# Altium footprint library PcbLib_ICs_part2.PcbLib: 66 footprints (part 3 of 5) (continued)
## LFCSP-24(CP-24-14) [mm] "QFN, 24-Leads, Body 4.00x4.00mm, Pitch 0.50mm, Thermal Pad 2.30x2.30mm, IPC Medium Density" (continued)
  text ".Designator" at -3.443,-1.467 h2
Top Text:
  lines w0.05: -2.65,-2.65 2.65,-2.65 2.65,2.65 -2.65,2.65 -2.65,-2.65
  lines w0.1: -0.5,0 0.5,0 ; 0,-0.5 0,0.5
3D body "AD9508_LFCSP24.x_t": height 0.8, standoff 0, extent -2.025,-2.025 2.025,2.025

## LFCSP-48(HCP-48-1) [mm] "QFN, 48-Leads, Body 7x7mm, Pitch 0.50mm, Thermal Pad 5.60x5.60mm, IPC Medium Density"
height 0.55
pads (49):
  rect 0.7x0.25 smd paste+0 mask+0.05: 1(-3.45,2.75)
  oval 0.7x0.25 smd paste+0 mask+0.05: 2(-3.45,2.25) 3(-3.45,1.75) 4(-3.45,1.25) 5(-3.45,0.75) 6(-3.45,0.25) 7(-3.45,-0.25) 8(-3.45,-0.75) 9(-3.45,-1.25) 10(-3.45,-1.75) 11(-3.45,-2.25) 12(-3.45,-2.75) 25(3.45,-2.75) 26(3.45,-2.25) 27(3.45,-1.75) 28(3.45,-1.25) 29(3.45,-0.75) 30(3.45,-0.25) 31(3.45,0.25) 32(3.45,0.75) 33(3.45,1.25) 34(3.45,1.75) 35(3.45,2.25) 36(3.45,2.75)
  oval 0.25x0.7 smd paste+0 mask+0.05: 13(-2.75,-3.45) 14(-2.25,-3.45) 15(-1.75,-3.45) 16(-1.25,-3.45) 17(-0.75,-3.45) 18(-0.25,-3.45) 19(0.25,-3.45) 20(0.75,-3.45) 21(1.25,-3.45) 22(1.75,-3.45) 23(2.25,-3.45) 24(2.75,-3.45) 37(2.75,3.45) 38(2.25,3.45) 39(1.75,3.45) 40(1.25,3.45) 41(0.75,3.45) 42(0.25,3.45) 43(-0.25,3.45) 44(-0.75,3.45) 45(-1.25,3.45) 46(-1.75,3.45) 47(-2.25,3.45) 48(-2.75,3.45)
  rrect10% 5.6x5.6 smd paste-50 mask+0.05: EP(0,0)
via -2,-1 diameter 0.7 hole 0.3
via -1,-2 diameter 0.7 hole 0.3
via 1,-2 diameter 0.7 hole 0.3
via 2,-1 diameter 0.7 hole 0.3
via 2,1 diameter 0.7 hole 0.3
via 1,2 diameter 0.7 hole 0.3
via -2,1 diameter 0.7 hole 0.3
via -1,2 diameter 0.7 hole 0.3
via 2,-2 diameter 0.7 hole 0.3
via -2,-2 diameter 0.7 hole 0.3
via -2,2 diameter 0.7 hole 0.3
via 2,2 diameter 0.7 hole 0.3
via 0,0 diameter 0.7 hole 0.3
via 1,1 diameter 0.7 hole 0.3
via -1,1 diameter 0.7 hole 0.3
via -1,-1 diameter 0.7 hole 0.3
via 1,-1 diameter 0.7 hole 0.3
via -1,0 diameter 0.7 hole 0.3
via 0,-1 diameter 0.7 hole 0.3
via 0,1 diameter 0.7 hole 0.3
via 1,0 diameter 0.7 hole 0.3
Top Overlay:
  circle w0.25: c-4.4,2.75 r0.125
  lines w0.2: -3.65,-3.275 -3.65,-3.65 -3.275,-3.65 ; -3.65,3.275 -3.65,3.65 -3.275,3.65 ; 3.275,-3.65 3.65,-3.65 3.65,-3.275 ; 3.275,3.65 3.65,3.65 3.65,3.275
Top Paste:
  region: -2.2,-2.7 -2.2,-2.2 -2.7,-2.2 -2.7,-2.7
  region: -1.5,-2.7 -1.5,-2.2 -2,-2.2 -2,-2.7
  region: -0.8,-2.7 -0.8,-2.2 -1.3,-2.2 -1.3,-2.7
  region: 2.7,-2.7 2.7,-2.2 2.2,-2.2 2.2,-2.7
  region: 1.3,-2.7 1.3,-2.2 0.8,-2.2 0.8,-2.7
  region: 2,-2.7 2,-2.2 1.5,-2.2 1.5,-2.7
  region: -0.1,-2.7 -0.1,-2.2 -0.6,-2.2 -0.6,-2.7
  region: 0.6,-2.7 0.6,-2.2 0.1,-2.2 0.1,-2.7
  region: -2.2,-2 -2.2,-1.5 -2.7,-1.5 -2.7,-2
  region: -1.5,-2 -1.5,-1.5 -2,-1.5 -2,-2
  region: -0.8,-2 -0.8,-1.5 -1.3,-1.5 -1.3,-2
  region: 2.7,-2 2.7,-1.5 2.2,-1.5 2.2,-2
  region: 1.3,-2 1.3,-1.5 0.8,-1.5 0.8,-2
  region: 2,-2 2,-1.5 1.5,-1.5 1.5,-2
  region: -0.1,-2 -0.1,-1.5 -0.6,-1.5 -0.6,-2
  region: 0.6,-2 0.6,-1.5 0.1,-1.5 0.1,-2
  region: -2.2,-1.3 -2.2,-0.8 -2.7,-0.8 -2.7,-1.3
  region: -1.5,-1.3 -1.5,-0.8 -2,-0.8 -2,-1.3
  region: -0.8,-1.3 -0.8,-0.8 -1.3,-0.8 -1.3,-1.3
  region: 2.7,-1.3 2.7,-0.8 2.2,-0.8 2.2,-1.3
  region: 1.3,-1.3 1.3,-0.8 0.8,-0.8 0.8,-1.3
  region: 2,-1.3 2,-0.8 1.5,-0.8 1.5,-1.3
  region: -0.1,-1.3 -0.1,-0.8 -0.6,-0.8 -0.6,-1.3
  region: 0.6,-1.3 0.6,-0.8 0.1,-0.8 0.1,-1.3
  region: 2.2,2.7 2.2,2.2 2.7,2.2 2.7,2.7
  region: 1.5,2.7 1.5,2.2 2,2.2 2,2.7
  region: 0.8,2.7 0.8,2.2 1.3,2.2 1.3,2.7
  region: -2.7,2.7 -2.7,2.2 -2.2,2.2 -2.2,2.7
  region: -1.3,2.7 -1.3,2.2 -0.8,2.2 -0.8,2.7
  region: -2,2.7 -2,2.2 -1.5,2.2 -1.5,2.7
  region: 0.1,2.7 0.1,2.2 0.6,2.2 0.6,2.7
  region: -0.6,2.7 -0.6,2.2 -0.1,2.2 -0.1,2.7
  region: 2.2,2 2.2,1.5 2.7,1.5 2.7,2
  region: 1.5,2 1.5,1.5 2,1.5 2,2
  region: 0.8,2 0.8,1.5 1.3,1.5 1.3,2
  region: -2.7,2 -2.7,1.5 -2.2,1.5 -2.2,2
  region: -1.3,2 -1.3,1.5 -0.8,1.5 -0.8,2
  region: -2,2 -2,1.5 -1.5,1.5 -1.5,2
  region: 0.1,2 0.1,1.5 0.6,1.5 0.6,2
  region: -0.6,2 -0.6,1.5 -0.1,1.5 -0.1,2
  region: 2.2,1.3 2.2,0.8 2.7,0.8 2.7,1.3
  region: 1.5,1.3 1.5,0.8 2,0.8 2,1.3
  region: 0.8,1.3 0.8,0.8 1.3,0.8 1.3,1.3
  region: -2.7,1.3 -2.7,0.8 -2.2,0.8 -2.2,1.3
  region: -1.3,1.3 -1.3,0.8 -0.8,0.8 -0.8,1.3
  region: -2,1.3 -2,0.8 -1.5,0.8 -1.5,1.3
  region: 0.1,1.3 0.1,0.8 0.6,0.8 0.6,1.3
  region: -0.6,1.3 -0.6,0.8 -0.1,0.8 -0.1,1.3
  region: 2.7,-0.6 2.7,-0.1 2.2,-0.1 2.2,-0.6
  region: 2.2,0.6 2.2,0.1 2.7,0.1 2.7,0.6
  region: 2,-0.6 2,-0.1 1.5,-0.1 1.5,-0.6
  region: 1.5,0.6 1.5,0.1 2,0.1 2,0.6
  region: 1.3,-0.6 1.3,-0.1 0.8,-0.1 0.8,-0.6
  region: 0.8,0.6 0.8,0.1 1.3,0.1 1.3,0.6
  region: -2.7,0.6 -2.7,0.1 -2.2,0.1 -2.2,0.6
  region: -2.2,-0.6 -2.2,-0.1 -2.7,-0.1 -2.7,-0.6
  region: -1.3,0.6 -1.3,0.1 -0.8,0.1 -0.8,0.6
  region: -2,0.6 -2,0.1 -1.5,0.1 -1.5,0.6
  region: -1.5,-0.6 -1.5,-0.1 -2,-0.1 -2,-0.6
  region: -0.8,-0.6 -0.8,-0.1 -1.3,-0.1 -1.3,-0.6
  region: 0.1,0.6 0.1,0.1 0.6,0.1 0.6,0.6
  region: -0.6,0.6 -0.6,0.1 -0.1,0.1 -0.1,0.6
  region: -0.1,-0.6 -0.1,-0.1 -0.6,-0.1 -0.6,-0.6
  region: 0.6,-0.6 0.6,-0.1 0.1,-0.1 0.1,-0.6
Bottom Solder:
  region: -2.8,2.8 -0.55,2.8 0,2.25 0.55,2.8 2.8,2.8 2.8,0.55 2.25,0 2.8,-0.55 2.8,-2.8 0.55,-2.8 0,-2.25 -0.55,-2.8 -2.8,-2.8 -2.8,-0.55 -2.25,0 -2.8,0.55
Top Assy:
  drawing of 173 lines, arcs and shapes, not listed
  text ".Designator" at -3.443,-1.967 h2
Top Text:
  lines w0.05: -4.05,-4.05 4.05,-4.05 4.05,4.05 -4.05,4.05 -4.05,-4.05
  lines w0.1: -0.5,0 0.5,0 ; 0,-0.5 0,0.5
3D body "HCP-48-1.x_t": height 0.9, standoff 0, extent -3.525,-3.525 3.525,3.525

## LQ100 [mm] "LQFP, 100-Leads, Body 14.00x14.00mm, Pitch 0.50mm, IPC Medium Density"
height 1.6
pads (100):
  rect 0.3x1.45 smd paste+0 mask+0.05: 1(-6,-7.725)
  oval 0.3x1.45 smd paste+0 mask+0.05: 2(-5.5,-7.725) 3(-5,-7.725) 4(-4.5,-7.725) 5(-4,-7.725) 6(-3.5,-7.725) 7(-3,-7.725) 8(-2.5,-7.725) 9(-2,-7.725) 10(-1.5,-7.725) 11(-1,-7.725) 12(-0.5,-7.725) 13(0,-7.725) 14(0.5,-7.725) 15(1,-7.725) 16(1.5,-7.725) 17(2,-7.725) 18(2.5,-7.725) 19(3,-7.725) 20(3.5,-7.725) 21(4,-7.725) 22(4.5,-7.725) 23(5,-7.725) 24(5.5,-7.725) 25(6,-7.725) 51(6,7.725) 52(5.5,7.725) 53(5,7.725) 54(4.5,7.725) 55(4,7.725) 56(3.5,7.725) 57(3,7.725) 58(2.5,7.725) 59(2,7.725) 60(1.5,7.725) 61(1,7.725) 62(0.5,7.725) 63(0,7.725) 64(-0.5,7.725) 65(-1,7.725) 66(-1.5,7.725) 67(-2,7.725) 68(-2.5,7.725) 69(-3,7.725) 70(-3.5,7.725) 71(-4,7.725) 72(-4.5,7.725) 73(-5,7.725) 74(-5.5,7.725) 75(-6,7.725)
  oval 1.45x0.3 smd paste+0 mask+0.05: 26(7.725,-6) 27(7.725,-5.5) 28(7.725,-5) 29(7.725,-4.5) 30(7.725,-4) 31(7.725,-3.5) 32(7.725,-3) 33(7.725,-2.5) 34(7.725,-2) 35(7.725,-1.5) 36(7.725,-1) 37(7.725,-0.5) 38(7.725,0) 39(7.725,0.5) 40(7.725,1) 41(7.725,1.5) 42(7.725,2) 43(7.725,2.5) 44(7.725,3) 45(7.725,3.5) 46(7.725,4) 47(7.725,4.5) 48(7.725,5) 49(7.725,5.5) 50(7.725,6) 76(-7.725,6) 77(-7.725,5.5) 78(-7.725,5) 79(-7.725,4.5) 80(-7.725,4) 81(-7.725,3.5) 82(-7.725,3) 83(-7.725,2.5) 84(-7.725,2) 85(-7.725,1.5) 86(-7.725,1) 87(-7.725,0.5) 88(-7.725,0) 89(-7.725,-0.5) 90(-7.725,-1) 91(-7.725,-1.5) 92(-7.725,-2) 93(-7.725,-2.5) 94(-7.725,-3) 95(-7.725,-3.5) 96(-7.725,-4) 97(-7.725,-4.5) 98(-7.725,-5) 99(-7.725,-5.5) 100(-7.725,-6)
Top Overlay:
  circle w0.6: c-5.5,-5.5 r0.3
  circle w0.25: c-6.75,-8.125 r0.125
  region: -6.4,-7.25 -6.4,-6.4 -7.25,-6.4 -7.25,-7.25
  lines w0.2: -7.15,6.525 -7.15,7.15 -6.55,7.15 ; 6.525,7.15 7.15,7.15 7.15,6.55 ; 6.55,-7.15 7.15,-7.15 7.15,-6.525
Bottom Simple Assy:
  rectangle: -8,5.888 -7,6.108
  rectangle: -8,5.388 -7,5.608
  rectangle: -8,4.888 -7,5.108
  rectangle: -8,4.388 -7,4.608
  rectangle: -8,2.388 -7,2.608
  rectangle: -8,2.888 -7,3.108
  rectangle: -8,3.388 -7,3.608
  rectangle: -8,3.888 -7,4.108
  rectangle: -8,-0.112 -7,0.108
  rectangle: -8,-0.612 -7,-0.392
  rectangle: -8,-1.112 -7,-0.893
  rectangle: -8,-1.612 -7,-1.392
  rectangle: -8,0.388 -7,0.608
  rectangle: -8,0.888 -7,1.108
  rectangle: -8,1.388 -7,1.608
  rectangle: -8,1.888 -7,2.108
  rectangle: -8,-4.112 -7,-3.892
  rectangle: -8,-4.612 -7,-4.392
  rectangle: -8,-5.113 -7,-4.893
  rectangle: -8,-5.613 -7,-5.393
  rectangle: -8,-3.612 -7,-3.393
  rectangle: -8,-3.113 -7,-2.893
  rectangle: -8,-2.612 -7,-2.392
  rectangle: -8,-2.112 -7,-1.892
  rectangle: -8,-6.112 -7,-5.892
  region: 5.89,7.998 5.89,6.998 6.11,6.998 6.11,7.998
  region: 5.39,7.998 5.39,6.998 5.61,6.998 5.61,7.998
  region: 4.89,7.998 4.89,6.998 5.11,6.998 5.11,7.998
  region: 4.39,7.998 4.39,6.998 4.61,6.998 4.61,7.998
  region: 2.39,7.998 2.39,6.998 2.61,6.998 2.61,7.998
  region: 2.89,7.998 2.89,6.998 3.11,6.998 3.11,7.998
  region: 3.39,7.998 3.39,6.998 3.61,6.998 3.61,7.998
  region: 3.89,7.998 3.89,6.998 4.11,6.998 4.11,7.998
  region: -0.11,7.998 -0.11,6.998 0.11,6.998 0.11,7.998
  region: -0.61,7.998 -0.61,6.998 -0.39,6.998 -0.39,7.998
  region: -1.11,7.998 -1.11,6.998 -0.89,6.998 -0.89,7.998
  region: -1.61,7.998 -1.61,6.998 -1.39,6.998 -1.39,7.998
  region: 0.39,7.998 0.39,6.998 0.61,6.998 0.61,7.998
  region: 0.89,7.998 0.89,6.998 1.11,6.998 1.11,7.998
  region: 1.39,7.998 1.39,6.998 1.61,6.998 1.61,7.998
  region: 1.89,7.998 1.89,6.998 2.11,6.998 2.11,7.998
  region: -4.11,7.998 -4.11,6.998 -3.89,6.998 -3.89,7.998
  region: -4.61,7.998 -4.61,6.998 -4.39,6.998 -4.39,7.998
  region: -5.11,7.998 -5.11,6.998 -4.89,6.998 -4.89,7.998
  region: -5.61,7.998 -5.61,6.998 -5.39,6.998 -5.39,7.998
  region: -3.61,7.998 -3.61,6.998 -3.39,6.998 -3.39,7.998
  region: -3.11,7.998 -3.11,6.998 -2.89,6.998 -2.89,7.998
  region: -2.61,7.998 -2.61,6.998 -2.39,6.998 -2.39,7.998
  region: -2.11,7.998 -2.11,6.998 -1.89,6.998 -1.89,7.998
  region: -6.11,7.998 -6.11,6.998 -5.89,6.998 -5.89,7.998
  region: 8,-5.892 7,-5.892 7,-6.112 8,-6.112
  region: 8,-5.392 7,-5.392 7,-5.612 8,-5.612
  region: 8,-4.892 7,-4.892 7,-5.112 8,-5.112
  region: 8,-4.392 7,-4.392 7,-4.612 8,-4.612
  region: 8,-2.392 7,-2.392 7,-2.612 8,-2.612
  region: 8,-2.892 7,-2.892 7,-3.112 8,-3.112
  region: 8,-3.392 7,-3.392 7,-3.612 8,-3.612
  region: 8,-3.892 7,-3.892 7,-4.112 8,-4.112
  region: 8,0.108 7,0.108 7,-0.112 8,-0.112
  region: 8,0.608 7,0.608 7,0.388 8,0.388
  region: 8,1.108 7,1.108 7,0.888 8,0.888
  region: 8,1.608 7,1.608 7,1.388 8,1.388
  region: 8,-0.392 7,-0.392 7,-0.612 8,-0.612
  region: 8,-0.892 7,-0.892 7,-1.112 8,-1.112
  region: 8,-1.392 7,-1.392 7,-1.612 8,-1.612
  region: 8,-1.892 7,-1.892 7,-2.112 8,-2.112
  region: 8,4.108 7,4.108 7,3.888 8,3.888
  region: 8,4.608 7,4.608 7,4.388 8,4.388
  region: 8,5.108 7,5.108 7,4.888 8,4.888
  region: 8,5.608 7,5.608 7,5.388 8,5.388
  region: 8,3.608 7,3.608 7,3.388 8,3.388
  region: 8,3.108 7,3.108 7,2.888 8,2.888
  region: 8,2.608 7,2.608 7,2.388 8,2.388
  region: 8,2.108 7,2.108 7,1.888 8,1.888
  region: 8,6.108 7,6.108 7,5.888 8,5.888
  region: 6.11,-8.002 6.11,-7.002 5.89,-7.002 5.89,-8.002
  region: 2.11,-8.002 2.11,-7.002 1.89,-7.002 1.89,-8.002
  region: 2.61,-8.002 2.61,-7.002 2.39,-7.002 2.39,-8.002
  region: 3.11,-8.003 3.11,-7.003 2.89,-7.003 2.89,-8.003
  region: 3.61,-8.003 3.61,-7.003 3.39,-7.003 3.39,-8.003
  region: 5.61,-8.003 5.61,-7.003 5.39,-7.003 5.39,-8.003
  region: 5.11,-8.003 5.11,-7.003 4.89,-7.003 4.89,-8.003
  region: 4.61,-8.002 4.61,-7.002 4.39,-7.002 4.39,-8.002
  region: 4.11,-8.002 4.11,-7.002 3.89,-7.002 3.89,-8.002
  region: -1.89,-8.002 -1.89,-7.002 -2.11,-7.002 -2.11,-8.002
  region: -1.39,-8.002 -1.39,-7.002 -1.61,-7.002 -1.61,-8.002
  region: -0.89,-8.003 -0.89,-7.003 -1.11,-7.003 -1.11,-8.003
  region: -0.39,-8.003 -0.39,-7.003 -0.61,-7.003 -0.61,-8.003
  region: 1.61,-8.003 1.61,-7.003 1.39,-7.003 1.39,-8.003
  region: 1.11,-8.003 1.11,-7.003 0.89,-7.003 0.89,-8.003
  region: 0.61,-8.002 0.61,-7.002 0.39,-7.002 0.39,-8.002
  region: 0.11,-8.002 0.11,-7.002 -0.11,-7.002 -0.11,-8.002
  region: -3.89,-8.002 -3.89,-7.002 -4.11,-7.002 -4.11,-8.002
  region: -3.39,-8.002 -3.39,-7.002 -3.61,-7.002 -3.61,-8.002
  region: -2.89,-8.003 -2.89,-7.003 -3.11,-7.003 -3.11,-8.003
  region: -2.39,-8.003 -2.39,-7.003 -2.61,-7.003 -2.61,-8.003
  region: -4.39,-8.003 -4.39,-7.003 -4.61,-7.003 -4.61,-8.003
  region: -4.89,-8.003 -4.89,-7.003 -5.11,-7.003 -5.11,-8.003
  region: -5.39,-8.002 -5.39,-7.002 -5.61,-7.002 -5.61,-8.002
  region: -5.89,-8.002 -5.89,-7.002 -6.11,-7.002 -6.11,-8.002
Top Assy:
  drawing of 1741 lines, arcs and shapes, not listed
  text ".Designator" at -3.443,-0.467 h2
Top Text:
  lines w0.05: -8.7,-8.7 -8.7,8.7 8.7,8.7 8.7,-8.7 -8.7,-8.7
  lines w0.1: -0.5,0 0.5,0 ; 0,-0.5 0,0.5
3D body "LQ100_LQ100X.STEP": height 1.45, standoff 0, extent -8,-8 8,8

## LQFP64M [mm] "WCH LQFP64M package with 0.5mm pitch"
height 1.6
pads (64):
  rect 0.3x1.45 smd paste+0 mask+0.05: 1(-3.75,-5.725)
  oval 0.3x1.45 smd paste+0 mask+0.05: 2(-3.25,-5.725) 3(-2.75,-5.725) 4(-2.25,-5.725) 5(-1.75,-5.725) 6(-1.25,-5.725) 7(-0.75,-5.725) 8(-0.25,-5.725) 9(0.25,-5.725) 10(0.75,-5.725) 11(1.25,-5.725) 12(1.75,-5.725) 13(2.25,-5.725) 14(2.75,-5.725) 15(3.25,-5.725) 16(3.75,-5.725) 33(3.75,5.725) 34(3.25,5.725) 35(2.75,5.725) 36(2.25,5.725) 37(1.75,5.725) 38(1.25,5.725) 39(0.75,5.725) 40(0.25,5.725) 41(-0.25,5.725) 42(-0.75,5.725) 43(-1.25,5.725) 44(-1.75,5.725) 45(-2.25,5.725) 46(-2.75,5.725) 47(-3.25,5.725) 48(-3.75,5.725)
  oval 1.45x0.3 smd paste+0 mask+0.05: 17(5.725,-3.75) 18(5.725,-3.25) 19(5.725,-2.75) 20(5.725,-2.25) 21(5.725,-1.75) 22(5.725,-1.25) 23(5.725,-0.75) 24(5.725,-0.25) 25(5.725,0.25) 26(5.725,0.75) 27(5.725,1.25) 28(5.725,1.75) 29(5.725,2.25) 30(5.725,2.75) 31(5.725,3.25) 32(5.725,3.75) 49(-5.725,3.75) 50(-5.725,3.25) 51(-5.725,2.75) 52(-5.725,2.25) 53(-5.725,1.75) 54(-5.725,1.25) 55(-5.725,0.75) 56(-5.725,0.25) 57(-5.725,-0.25) 58(-5.725,-0.75) 59(-5.725,-1.25) 60(-5.725,-1.75) 61(-5.725,-2.25) 62(-5.725,-2.75) 63(-5.725,-3.25) 64(-5.725,-3.75)
Top Overlay:
  circle w0.25: c-4.5,-6.125 r0.125
  region: -4.2,-5.25 -4.2,-4.2 -5.25,-4.2 -5.25,-5.25
  lines w0.2: -7.25,-3.75 -6.75,-3.75 ; -7.25,0.25 -6.75,0.25 ; -7.25,3.75 -6.75,3.75 ; -5.25,4.25 -5.25,5.25 -4.25,5.25 ; -3.75,-7.25 -3.75,-6.75 ; -3.75,6.75 -3.75,7.25 ; -0.25,-7.25 -0.25,-6.75 ; 0.25,6.75 0.25,7.25 ; 3.75,-7.25 3.75,-6.75 ; 3.75,6.75 3.75,7.25 ; 4.25,-5.25 5.25,-5.25 5.25,-4.25 ; 4.25,5.25 5.25,5.25 5.25,4.25 ; 6.75,-3.75 7.25,-3.75 ; 6.75,-0.25 7.25,-0.25 ; 6.75,3.75 7.25,3.75
Top Assy:
  drawing of 1402 lines, arcs and shapes, not listed
  text ".Designator" at -3.443,-2.167 h2
Top Text:
  lines w0.05: -6.7,-6.7 6.7,-6.7 6.7,6.7 -6.7,6.7 -6.7,-6.7
  lines w0.1: -0.5,0 0.5,0 ; 0,-0.5 0,0.5
3D body "LQFP64M_PARASOLID.x_t": height 1.6, standoff 0, extent -6,-6 6,6

## MMM1362 [mm] "Case style MMM1362"
pads (4):
  rect 0.5x0.95 smd paste-0.025 mask+0.05: 1(-0.65,-1.1)
  rrect50% 0.8x0.95 smd paste-0.025 mask+0.05: 2(0.5,-1.1)
  rrect50% 0.5x0.95 smd paste-0.025 mask+0.05: 3(0.65,1.1) 4(-0.65,1.1)
Top Overlay:
  circle w0.2: c-1.3,-1.15 r0.1
  lines w0.2: -1.15,-0.6 -1.15,0.6 ; 1.15,-0.6 1.15,0.6
Top Assy:
  circle w0.05: c-0.775,-0.375 r0.15
  lines w0.05: -1.025,-0.625 -0.995,-0.595 ; -1.025,-0.625 -1.025,0.625 ; -1.025,-0.625 -0.813,-0.625 ; -1.025,0.625 -0.995,0.595 ; -1.025,0.625 -0.813,0.625 ; -0.995,-0.595 -0.995,0.595 ; -0.995,-0.595 0.995,-0.595 ; -0.995,0.595 0.995,0.595 ; -0.813,-0.961 -0.487,-0.961 ; -0.813,-0.961 -0.813,-0.893 ; -0.813,-0.961 -0.813,-1.055 -0.487,-1.055 -0.487,-0.961 ; -0.813,-0.893 -0.813,-0.834 ; -0.813,-0.893 -0.487,-0.893 ; -0.813,-0.834 -0.487,-0.834 ; -0.813,-0.834 -0.813,-0.686 ; -0.813,-0.686 -0.487,-0.686 ; -0.813,-0.686 -0.813,-0.625 ; -0.813,-0.625 -0.487,-0.625 ; -0.813,0.625 -0.813,0.686 ; -0.813,0.625 -0.487,0.625 ; -0.813,0.686 -0.813,0.834 ; -0.813,0.686 -0.487,0.686 ; -0.813,0.834 -0.487,0.834 ; -0.813,0.834 -0.813,0.893 ; -0.813,0.893 -0.487,0.893 ; -0.813,0.893 -0.813,0.961 ; -0.813,0.961 -0.487,0.961 ; -0.813,0.961 -0.813,1.055 -0.487,1.055 -0.487,0.961 ; -0.487,-0.961 -0.487,-0.893 ; -0.487,-0.893 -0.487,-0.834 ; -0.487,-0.834 -0.487,-0.686 ; -0.487,-0.686 -0.487,-0.625 ; -0.487,-0.625 0.188,-0.625 ; -0.487,0.625 -0.487,0.686 ; -0.487,0.625 0.487,0.625 ; -0.487,0.686 -0.487,0.834 ; -0.487,0.834 -0.487,0.893 ; -0.487,0.893 -0.487,0.961 ; 0.188,-0.961 0.188,-0.893 ; 0.188,-0.961 0.812,-0.961 ; 0.188,-0.961 0.188,-1.055 0.813,-1.055 0.812,-0.961 ; 0.188,-0.893 0.812,-0.893 ; 0.188,-0.893 0.188,-0.834 ; 0.188,-0.834 0.813,-0.834 ; 0.188,-0.834 0.188,-0.686 ; 0.188,-0.686 0.813,-0.686 ; 0.188,-0.686 0.188,-0.625 ; 0.188,-0.625 0.813,-0.625 ; 0.487,0.625 0.487,0.686 ; 0.487,0.625 0.813,0.625 ; 0.487,0.686 0.813,0.686 ; 0.487,0.686 0.487,0.834 ; 0.487,0.834 0.812,0.834 ; 0.487,0.834 0.487,0.893 ; 0.487,0.893 0.812,0.893 ; 0.487,0.893 0.487,0.961 ; 0.487,0.961 0.813,0.961 ; 0.487,0.961 0.487,1.055 0.813,1.055 0.813,0.961 ; 0.812,-0.961 0.812,-0.893 ; 0.812,-0.893 0.813,-0.834 ; 0.813,-0.834 0.813,-0.686 ; 0.813,-0.686 0.813,-0.625 ; 0.813,-0.625 1.025,-0.625 ; 0.813,0.625 0.813,0.686 ; 0.813,0.625 1.025,0.625 ; 0.813,0.686 0.812,0.834 ; 0.812,0.834 0.812,0.893 ; 0.812,0.893 0.813,0.961 ; 0.995,-0.595 0.995,0.595 ; 0.995,-0.595 1.025,-0.625 ; 0.995,0.595 1.025,0.625 ; 1.025,-0.625 1.025,0.625
  text ".Designator" at -1.719,-0.233 h1
3D body "MMM1362.x_t": height 1.1, standoff 0, extent -1.025,-1.055 1.025,1.055

## PDFN8L3X3 [mm] "Power 3mm x 3mm"
pads (11):
  rect 0.35x0.6 smd paste-0.05 mask+0.05: 1(-0.975,-1.625) 1(-0.325,-1.625) 1(0.325,-1.625) 2(0.975,-1.625) 3(-0.975,1.625) 3(-0.325,1.625) 3(0.325,1.625) 3(0.975,1.625)
  rect 0.3x0.8 smd paste-0.05 mask+0.05: 3(-1.55,0) 3(1.55,0)
  rect 3x2.3 smd paste-5 mask+0.05: 3(0,0.35)
Top Overlay:
  circle w0.2: c-1,-2.3 r0.1
  lines w0.2: -1.825,-0.75 -1.825,-1.85 -1.5,-1.85 ; -1.825,0.75 -1.825,1.85 -1.5,1.85 ; 1.5,-1.85 1.825,-1.85 1.825,-0.75 ; 1.5,1.85 1.825,1.85 1.825,0.75
Top Paste:
  region: 1.3,1.25 0.8,1.25 0.8,0.75 1.3,0.75
  region: 0.6,1.25 0.1,1.25 0.1,0.75 0.6,0.75
  region: -0.8,1.25 -1.3,1.25 -1.3,0.75 -0.8,0.75
  region: -0.1,1.25 -0.6,1.25 -0.6,0.75 -0.1,0.75
  rectangle: -1.3,0.05 -0.8,0.55
  rectangle: -0.6,0.05 -0.1,0.55
  rectangle: 0.8,0.05 1.3,0.55
  rectangle: 0.1,0.05 0.6,0.55
  rectangle: -1.3,-0.65 -0.8,-0.15
  rectangle: -0.6,-0.65 -0.1,-0.15
  rectangle: 0.8,-0.65 1.3,-0.15
  rectangle: 0.1,-0.65 0.6,-0.15
Top Assy:
  circle w0.05: c-1.05,-1.05 r0.225
  lines w0.05: -1.5,-0.125 -1.6,-0.125 -1.6,0.125 -1.5,0.125 ; -1.125,-1.5 -1.5,-1.5 ; -1.125,1.5 -1.5,1.5 ; -0.825,-1.5 -0.475,-1.5 ; -0.825,1.5 -0.475,1.5 ; -0.175,-1.5 0.175,-1.5 ; -0.175,1.5 0.175,1.5 ; 0.475,-1.5 0.825,-1.5 ; 0.475,1.5 0.825,1.5 ; 1.125,-1.5 1.5,-1.5 ; 1.125,1.5 1.5,1.5 ; 1.5,-0.125 1.6,-0.125 1.6,0.125 1.5,0.125 ; -1.5,-1.5 -1.5,1.5 ; -1.5,-1.5 -1.42,-1.42 ; -1.5,1.5 -1.42,1.42 ; -1.42,-1.42 -1.42,1.42 ; -1.42,-1.42 1.42,-1.42 ; -1.42,1.42 1.42,1.42 ; 1.42,-1.42 1.5,-1.5 ; 1.42,-1.42 1.42,1.42 ; 1.42,1.42 1.5,1.5 ; 1.5,-1.5 1.5,1.5 ; -1.125,-1.63 -1.125,-1.498 -0.825,-1.498 -0.825,-1.63 -1.125,-1.63 ; -1.125,1.498 -1.125,1.63 -0.825,1.63 -0.825,1.498 -1.125,1.498 ; -0.475,-1.63 -0.475,-1.498 -0.175,-1.498 -0.175,-1.63 -0.475,-1.63 ; -0.475,1.498 -0.475,1.63 -0.175,1.63 -0.175,1.498 -0.475,1.498 ; 0.175,-1.63 0.475,-1.63 0.475,-1.498 0.175,-1.498 0.175,-1.63 ; 0.175,1.498 0.175,1.63 0.475,1.63 0.475,1.498 0.175,1.498 ; 0.825,-1.63 0.825,-1.498 1.125,-1.498 1.125,-1.63 0.825,-1.63 ; 0.825,1.498 0.825,1.63 1.125,1.63 1.125,1.498 0.825,1.498
  text ".Designator" at -3.443,-0.467 h2
3D body "PDFN8L3X3.STEP": height 0.9, standoff 0, extent -1.6,-1.63 1.6,1.63

## PVSON-14 [mm] "PVSON-14 4mm x 3mm, 0.4mm pitch"
pads (23):
  rect 0.25x0.6 smd paste-0.025 mask+0.05: 1(-1.5,-1.4)
  rrect50% 0.25x0.6 smd paste-0.025 mask+0.05: 2(-1,-1.4) 3(-0.5,-1.4) 4(0,-1.4) 5(0.5,-1.4) 6(1,-1.4) 7(1.5,-1.4) 8(1.5,1.4) 9(1,1.4) 10(0.5,1.4) 11(0,1.4) 12(-0.5,1.4) 13(-1,1.4) 14(-1.5,1.4)
  rect 0.8x0.2 smd paste-0.025 mask+0.05: EP(-1.8,-0.69) EP(-1.8,-0.23) EP(-1.8,0.23) EP(-1.8,0.69) EP(1.8,-0.69) EP(1.8,-0.23) EP(1.8,0.23) EP(1.8,0.69)
  rect 2.85x1.58 smd paste-3 mask+0.05: EP(0,0)
Top Overlay:
  circle w0.2: c-1.5,-2.1 r0.1
  lines w0.2: -2.2,-1.1 -2.2,-1.7 -2,-1.7 ; -2.2,1.1 -2.2,1.7 -2,1.7 ; 2,-1.7 2.2,-1.7 2.2,-1.1 ; 2,1.7 2.2,1.7 2.2,1.1
Top Paste:
  region: -0.5,0.7 -1.1,0.7 -1.1,0.1 -0.5,0.1
  region: -0.5,-0.1 -1.1,-0.1 -1.1,-0.7 -0.5,-0.7
  region: 1.1,0.7 0.5,0.7 0.5,0.1 1.1,0.1
  region: 0.3,0.7 -0.3,0.7 -0.3,0.1 0.3,0.1
  region: 1.1,-0.1 0.5,-0.1 0.5,-0.7 1.1,-0.7
  region: 0.3,-0.1 -0.3,-0.1 -0.3,-0.7 0.3,-0.7
Top Assy:
  circle w0.05: c-1.6,-1.1 r0.2
  lines w0.05: -2,-0.79 -2.02,-0.79 -2.02,-0.59 -2,-0.59 ; -2,-0.33 -2.02,-0.33 -2.02,-0.13 -2,-0.13 ; -2,0.13 -2.02,0.13 -2.02,0.33 -2,0.33 ; -2,0.59 -2.02,0.59 -2.02,0.79 -2,0.79 ; -1.62,-1.5 -1.62,-1.52 -1.38,-1.52 -1.38,-1.5 ; -1.62,1.5 -1.62,1.52 -1.38,1.52 -1.38,1.5 ; -1.12,-1.5 -1.12,-1.52 -0.88,-1.52 -0.88,-1.5 ; -1.12,1.5 -1.12,1.52 -0.88,1.52 -0.88,1.5 ; -0.62,-1.5 -0.62,-1.52 -0.38,-1.52 -0.38,-1.5 ; -0.62,1.5 -0.62,1.52 -0.38,1.52 -0.38,1.5 ; -0.12,-1.5 -0.12,-1.52 0.12,-1.52 0.12,-1.5 ; -0.12,1.5 -0.12,1.52 0.12,1.52 0.12,1.5 ; 0.38,-1.5 0.38,-1.52 0.62,-1.52 0.62,-1.5 ; 0.38,1.5 0.38,1.52 0.62,1.52 0.62,1.5 ; 0.88,-1.5 0.88,-1.52 1.12,-1.52 1.12,-1.5 ; 0.88,1.5 0.88,1.52 1.12,1.52 1.12,1.5 ; 1.38,-1.5 1.38,-1.52 1.62,-1.52 1.62,-1.5 ; 1.38,1.5 1.38,1.52 1.62,1.52 1.62,1.5 ; 2,-0.79 2.02,-0.79 2.02,-0.59 2,-0.59 ; 2,-0.33 2.02,-0.33 2.02,-0.13 2,-0.13 ; 2,0.13 2.02,0.13 2.02,0.33 2,0.33 ; 2,0.59 2.02,0.59 2.02,0.79 2,0.79 ; -2,-1.5 -2,1.5 2,1.5 2,-1.5 -2,-1.5
  text ".Designator" at -3.443,-0.467 h2
3D body "PVSON-14.x_t": height 1, standoff 0, extent -2.02,-1.52 2.02,1.52

## PWSON-10 [mm] "Power QFN 3mm x 3mm"
pads (19):
  rect 0.25x0.85 smd paste-0.025 mask+0.05: 1(-1,-1.475)
  oval 0.25x0.85 smd paste-0.025 mask+0.05: 2(-0.5,-1.475) 3(0,-1.475) 4(0.5,-1.475) 5(1,-1.475) 6(1,1.475) 7(0.5,1.475) 8(0,1.475) 9(-0.5,1.475) 10(-1,1.475)
  rect 1.05x0.25 smd paste-3 mask+0.05: EP(-1.375,-0.2) EP(-1.375,0.2) EP(-1.375,-0.6) EP(-1.375,0.6) EP(1.375,-0.6) EP(1.375,0.6) EP(1.375,-0.2) EP(1.375,0.2)
  rect 2.15x1.7 smd paste-3 mask+0.05: EP(0,0)
Top Overlay:
  circle w0.2: c-1,-2.3 r0.1
  lines w0.2: -1.7,-1 -1.7,-1.7 -1.5,-1.7 ; -1.7,1 -1.7,1.7 -1.5,1.7 ; 1.5,-1.7 1.7,-1.7 1.7,-1 ; 1.5,1.7 1.7,1.7 1.7,1
Top Paste:
  rectangle: 0.1,0.1 1,0.7
  rectangle: 0.1,-0.7 1,-0.1
  rectangle: -1.875,0.1 -1.175,0.3
  rectangle: -1.875,0.5 -1.175,0.7
  rectangle: -1.875,-0.3 -1.175,-0.1
  rectangle: -1.875,-0.7 -1.175,-0.5
  region: 1.875,-0.1 1.175,-0.1 1.175,-0.3 1.875,-0.3
  region: 1.875,-0.5 1.175,-0.5 1.175,-0.7 1.875,-0.7
  region: 1.875,0.3 1.175,0.3 1.175,0.1 1.875,0.1
  region: 1.875,0.7 1.175,0.7 1.175,0.5 1.875,0.5
  region: -0.1,0.7 -1,0.7 -1,0.1 -0.1,0.1
  region: -0.1,-0.1 -1,-0.1 -1,-0.7 -0.1,-0.7
Top Assy:
  circle w0.05: c-1.1,-1.1 r0.225
  lines w0.05: -1.5,-0.7 -1.52,-0.7 -1.52,-0.5 -1.5,-0.5 ; -1.5,-0.3 -1.52,-0.3 -1.52,-0.1 -1.5,-0.1 ; -1.5,0.1 -1.52,0.1 -1.52,0.3 -1.5,0.3 ; -1.5,0.5 -1.52,0.5 -1.52,0.7 -1.5,0.7 ; -1.12,-1.5 -1.12,-1.52 -0.88,-1.52 -0.88,-1.5 ; -1.12,1.5 -1.12,1.52 -0.88,1.52 -0.88,1.5 ; -0.62,-1.5 -0.62,-1.52 -0.38,-1.52 -0.38,-1.5 ; -0.62,1.5 -0.62,1.52 -0.38,1.52 -0.38,1.5 ; -0.12,-1.5 -0.12,-1.52 0.12,-1.52 0.12,-1.5 ; -0.12,1.5 -0.12,1.52 0.12,1.52 0.12,1.5 ; 0.38,-1.5 0.38,-1.52 0.62,-1.52 0.62,-1.5 ; 0.38,1.5 0.38,1.52 0.62,1.52 0.62,1.5 ; 0.88,-1.5 0.88,-1.52 1.12,-1.52 1.12,-1.5 ; 0.88,1.5 0.88,1.52 1.12,1.52 1.12,1.5 ; 1.5,-0.7 1.52,-0.7 1.52,-0.5 1.5,-0.5 ; 1.5,-0.3 1.52,-0.3 1.52,-0.1 1.5,-0.1 ; 1.5,0.1 1.52,0.1 1.52,0.3 1.5,0.3 ; 1.5,0.5 1.52,0.5 1.52,0.7 1.5,0.7 ; -1.5,-1.5 1.5,-1.5 1.5,1.5 -1.5,1.5 -1.5,-1.5
  text ".Designator" at -3.443,-0.467 h2
3D body "PWSON-10.x_t": height 0.8, standoff 0.03, extent -1.52,-1.52 1.52,1.52